# Altium schematic symbol library 13-Logic 数字 IC.SchLib: 324 symbols (part 11 of 30)
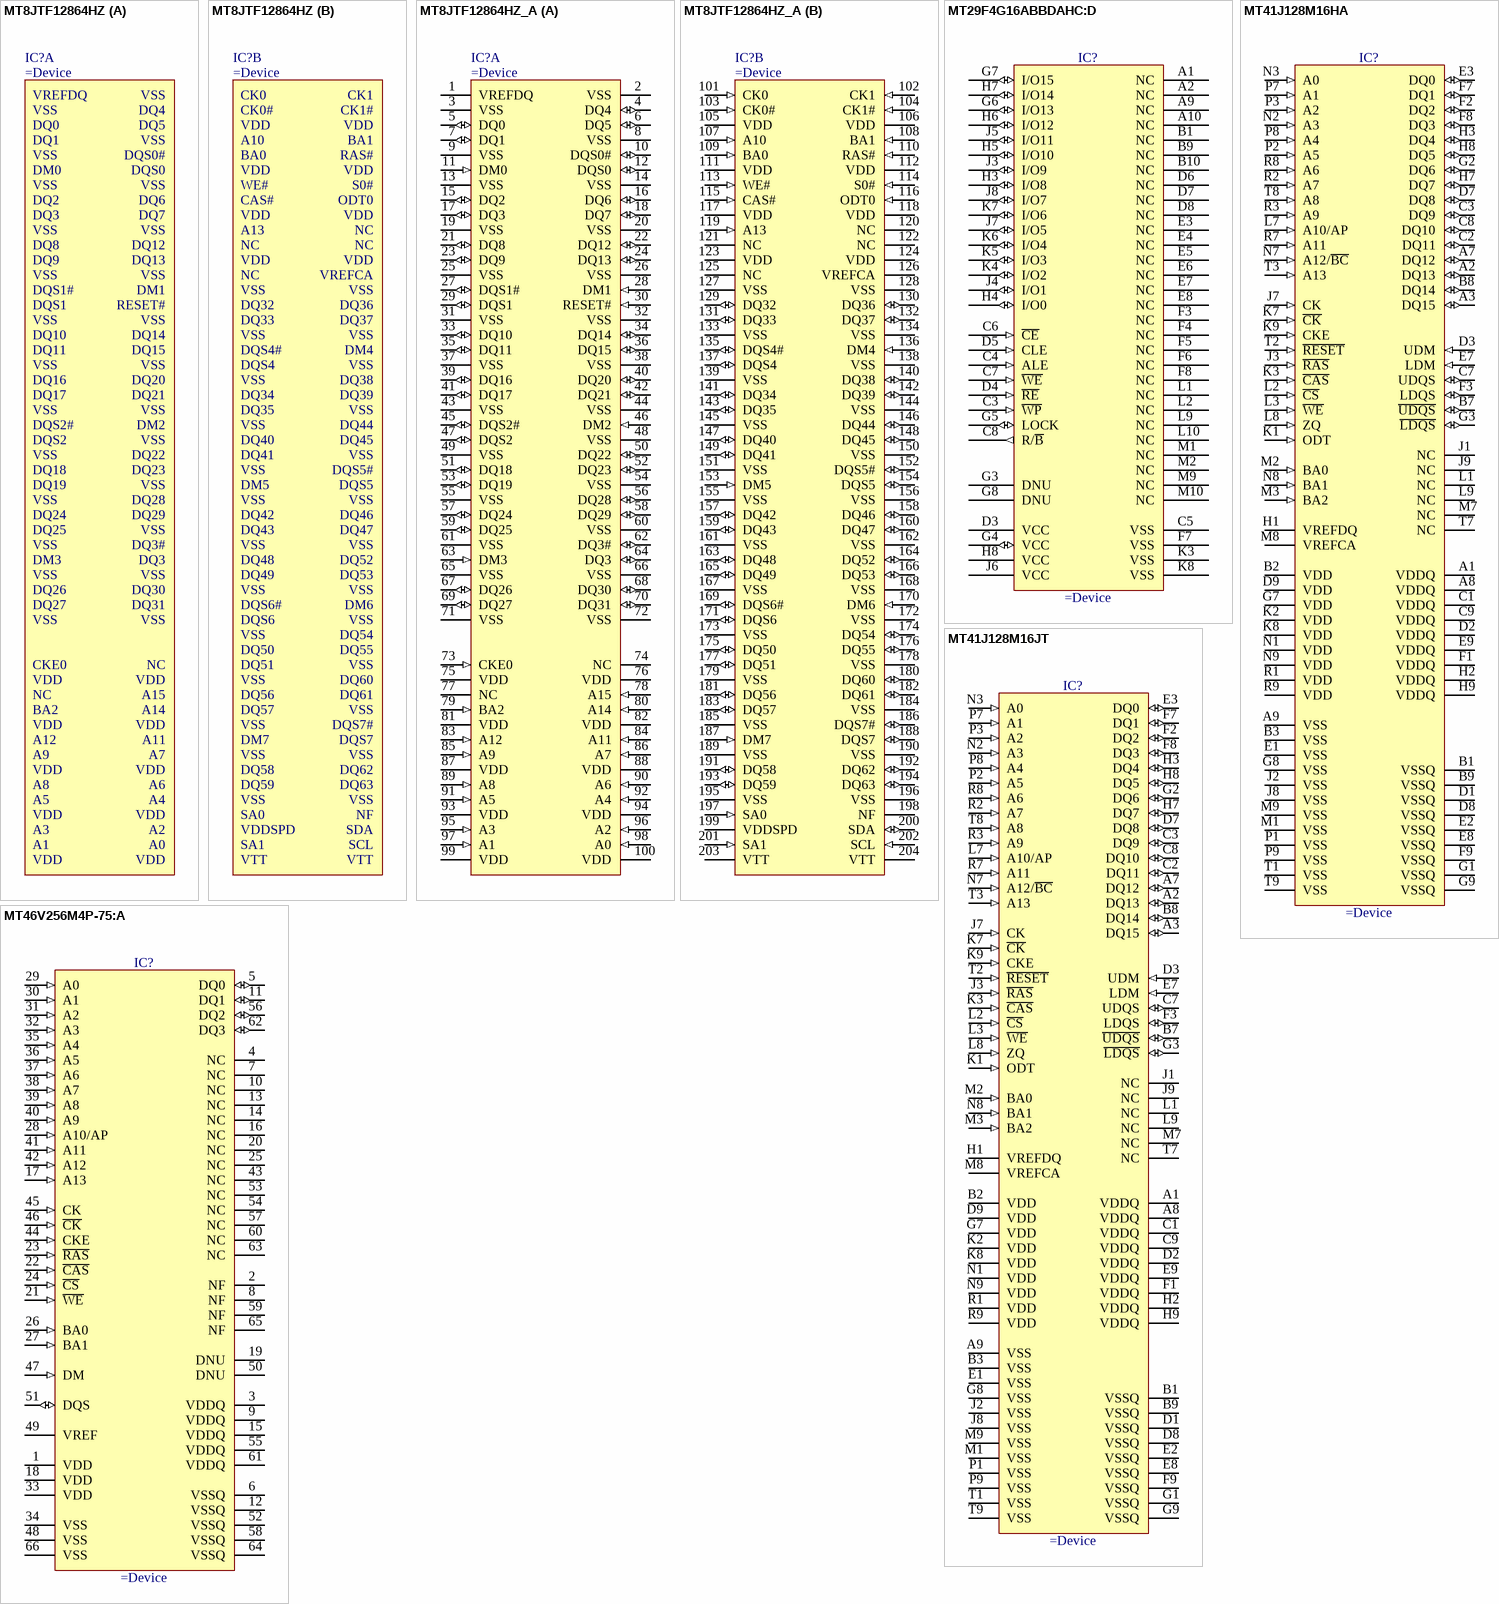
[diagram p173: symbols MT8JTF12864HZ to MT46V256M4P-75:A]

## MT8JTF12864HZ_A
designator IC?
1Gb (128Mx64) SODIMM 204-Pin DDR3 SDRAM Module
part A pins: 1 VREFDQ (power), 2 VSS (power), 3 VSS (power), 4 DQ4 (io), 5 DQ0 (io), 6 DQ5 (io), 7 DQ1 (io), 8 VSS (power), 9 VSS (power), 10 DQS0# (io), 11 DM0 (in), 12 DQS0 (io), 13 VSS (power), 14 VSS (power), 15 DQ2 (io), 16 DQ6 (io), 17 DQ3 (io), 18 DQ7 (io), 19 VSS (power), 20 VSS (power), 21 DQ8 (io), 22 DQ12 (io), 23 DQ9 (io), 24 DQ13 (io), 25 VSS (power), 26 VSS (power), 27 DQS1# (io), 28 DM1 (in), 29 DQS1 (io), 30 RESET# (in), 31 VSS (power), 32 VSS (power), 33 DQ10 (io), 34 DQ14 (io), 35 DQ11 (io), 36 DQ15 (io), 37 VSS (power), 38 VSS (power), 39 DQ16 (io), 40 DQ20 (io), 41 DQ17 (io), 42 DQ21 (io), 43 VSS (power), 44 VSS (power), 45 DQS2# (io), 46 DM2 (in), 47 DQS2 (io), 48 VSS (power), 49 VSS (power), 50 DQ22 (io), 51 DQ18 (io), 52 DQ23 (io), 53 DQ19 (io), 54 VSS (power), 55 VSS (power), 56 DQ28 (io), 57 DQ24 (io), 58 DQ29 (io), 59 DQ25 (io), 60 VSS (power), 61 VSS (power), 62 DQ3# (io), 63 DM3 (in), 64 DQ3 (io), 65 VSS (power), 66 VSS (power), 67 DQ26 (io), 68 DQ30 (io), 69 DQ27 (io), 70 DQ31 (io), 71 VSS (power), 72 VSS (power), 73 CKE0 (in), 74 NC, 75 VDD (power), 76 VDD (power), 77 NC, 78 A15 (in), 79 BA2 (in), 80 A14 (in), 81 VDD (power), 82 VDD (power), 83 A12 (in), 84 A11 (in), 85 A9 (in), 86 A7 (in), 87 VDD (power), 88 VDD (power), 89 A8 (in), 90 A6 (in), 91 A5 (in), 92 A4 (in), 93 VDD (power), 94 VDD (power), 95 A3 (in), 96 A2 (in), 97 A1 (in), 98 A0 (in), 99 VDD (power), 100 VDD (power)
part B pins: 101 CK0 (in), 102 CK1 (in), 103 CK0# (in), 104 CK1# (in), 105 VDD (power), 106 VDD (power), 107 A10 (in), 108 BA1 (in), 109 BA0 (in), 110 RAS# (in), 111 VDD (power), 112 VDD (power), 113 WE# (in), 114 S0# (in), 115 CAS# (in), 116 ODT0 (in), 117 VDD (power), 118 VDD (power), 119 A13 (in), 120 NC, 121 NC, 122 NC, 123 VDD (power), 124 VDD (power), 125 NC, 126 VREFCA (power), 127 VSS (power), 128 VSS (power), 129 DQ32 (io), 130 DQ36 (io), 131 DQ33 (io), 132 DQ37 (io), 133 VSS (power), 134 VSS (power), 135 DQS4# (io), 136 DM4 (in), 137 DQS4 (io), 138 VSS (power), 139 VSS (power), 140 DQ38 (io), 141 DQ34 (io), 142 DQ39 (io), 143 DQ35 (io), 144 VSS (power), 145 VSS (power), 146 DQ44 (io), 147 DQ40 (io), 148 DQ45 (io), 149 DQ41 (io), 150 VSS (power), 151 VSS (power), 152 DQS5# (io), 153 DM5 (in), 154 DQS5 (io), 155 VSS (power), 156 VSS (power), 157 DQ42 (io), 158 DQ46 (io), 159 DQ43 (io), 160 DQ47 (io), 161 VSS (power), 162 VSS (power), 163 DQ48 (io), 164 DQ52 (io), 165 DQ49 (io), 166 DQ53 (io), 167 VSS (power), 168 VSS (power), 169 DQS6# (io), 170 DM6 (in), 171 DQS6 (io), 172 VSS (power), 173 VSS (power), 174 DQ54 (io), 175 DQ50 (io), 176 DQ55 (io), 177 DQ51 (io), 178 VSS (power), 179 VSS (power), 180 DQ60 (io), 181 DQ56 (io), 182 DQ61 (io), 183 DQ57 (io), 184 VSS (power), 185 VSS (power), 186 DQS7# (io), 187 DM7 (in), 188 DQS7 (io), 189 VSS (power), 190 VSS (power), 191 DQ58 (io), 192 DQ62 (io), 193 DQ59 (io), 194 DQ63 (io), 195 VSS (power), 196 VSS (power), 197 SA0 (in), 198 NF, 199 VDDSPD (power), 200 SDA (io), 201 SA1 (in), 202 SCL (in), 203 VTT (power), 204 VTT (power)

## MT29F4G16ABBDAHC:D
designator IC?
4Gb, 16-Bit, 1.8V, NAND Flash
pins: A1 NC, A2 NC, A9 NC, A10 NC, B1 NC, B9 NC, B10 NC, C3 ~{WP} (in), C4 ALE (in), C5 VSS (power), C6 ~{CE} (in), C7 ~{WE} (in), C8 R/~{B} (out), D3 VCC (power), D4 ~{RE} (in), D5 CLE (in), D6 NC, D7 NC, D8 NC, E3 NC, E4 NC, E5 NC, E6 NC, E7 NC, E8 NC, F3 NC, F4 NC, F5 NC, F6 NC, F7 VSS (power), F8 NC, G3 DNU, G4 VCC (io), G5 LOCK (io), G6 I/O13 (io), G7 I/O15 (io), G8 DNU, H3 I/O8 (io), H4 I/O0 (io), H5 I/O10 (io), H6 I/O12 (io), H7 I/O14 (io), H8 VCC (power), J3 I/O9 (io), J4 I/O1 (io), J5 I/O11 (io), J6 VCC (power), J7 I/O5 (io), J8 I/O7 (io), K3 VSS (power), K4 I/O2 (io), K5 I/O3 (io), K6 I/O4 (io), K7 I/O6 (io), K8 VSS (power), L1 NC, L2 NC, L9 NC, L10 NC, M1 NC, M2 NC, M9 NC, M10 NC

## MT41J128M16HA
designator IC?
16 Meg x 16 x 8 Banks DDR3 SDRAM
pins: A1 VDDQ (power), A2 DQ13 (io), A3 DQ15 (io), A7 DQ12 (io), A8 VDDQ (power), A9 VSS (power), B1 VSSQ (power), B2 VDD (power), B3 VSS (power), B7 ~{UDQS} (io), B8 DQ14 (io), B9 VSSQ (power), C1 VDDQ (power), C2 DQ11 (io), C3 DQ9 (io), C7 UDQS (io), C8 DQ10 (io), C9 VDDQ (power), D1 VSSQ (power), D2 VDDQ (power), D3 UDM (in), D7 DQ8 (io), D8 VSSQ (power), D9 VDD (power), E1 VSS (power), E2 VSSQ (power), E3 DQ0 (io), E7 LDM (in), E8 VSSQ (power), E9 VDDQ (power), F1 VDDQ (power), F2 DQ2 (io), F3 LDQS (io), F7 DQ1 (io), F8 DQ3 (io), F9 VSSQ (power), G1 VSSQ (power), G2 DQ6 (io), G3 ~{LDQS} (io), G7 VDD (power), G8 VSS (power), G9 VSSQ (power), H1 VREFDQ (power), H2 VDDQ (power), H3 DQ4 (io), H7 DQ7 (io), H8 DQ5 (io), H9 VDDQ (power), J1 NC, J2 VSS (power), J3 ~{RAS} (in), J7 CK (in), J8 VSS (power), J9 NC, K1 ODT (in), K2 VDD (power), K3 ~{CAS} (in), K7 ~{CK} (in), K8 VDD (power), K9 CKE (in), L1 NC, L2 ~{CS} (in), L3 ~{WE} (in), L7 A10/AP (in), L8 ZQ (in), L9 NC, M1 VSS (power), M2 BA0 (in), M3 BA2 (in), M7 NC, M8 VREFCA (power), M9 VSS (power), N1 VDD (power), N2 A3 (in), N3 A0 (in), N7 A12/~{BC} (in), N8 BA1 (in), N9 VDD (power), P1 VSS (power), P2 A5 (in), P3 A2 (in), P7 A1 (in), P8 A4 (in), P9 VSS (power), R1 VDD (power), R2 A7 (in), R3 A9 (in), R7 A11 (in), R8 A6 (in), R9 VDD (power), T1 VSS (power), T2 ~{RESET} (in), T3 A13 (in), T7 NC, T8 A8 (in), T9 VSS (power)

## MT41J128M16JT
designator IC?
16 Meg x 16 x 8 Banks DDR3 SDRAM
pins: A1 VDDQ (power), A2 DQ13 (io), A3 DQ15 (io), A7 DQ12 (io), A8 VDDQ (power), A9 VSS (power), B1 VSSQ (power), B2 VDD (power), B3 VSS (power), B7 ~{UDQS} (io), B8 DQ14 (io), B9 VSSQ (power), C1 VDDQ (power), C2 DQ11 (io), C3 DQ9 (io), C7 UDQS (io), C8 DQ10 (io), C9 VDDQ (power), D1 VSSQ (power), D2 VDDQ (power), D3 UDM (in), D7 DQ8 (io), D8 VSSQ (power), D9 VDD (power), E1 VSS (power), E2 VSSQ (power), E3 DQ0 (io), E7 LDM (in), E8 VSSQ (power), E9 VDDQ (power), F1 VDDQ (power), F2 DQ2 (io), F3 LDQS (io), F7 DQ1 (io), F8 DQ3 (io), F9 VSSQ (power), G1 VSSQ (power), G2 DQ6 (io), G3 ~{LDQS} (io), G7 VDD (power), G8 VSS (power), G9 VSSQ (power), H1 VREFDQ (power), H2 VDDQ (power), H3 DQ4 (io), H7 DQ7 (io), H8 DQ5 (io), H9 VDDQ (power), J1 NC, J2 VSS (power), J3 ~{RAS} (in), J7 CK (in), J8 VSS (power), J9 NC, K1 ODT (in), K2 VDD (power), K3 ~{CAS} (in), K7 ~{CK} (in), K8 VDD (power), K9 CKE (in), L1 NC, L2 ~{CS} (in), L3 ~{WE} (in), L7 A10/AP (in), L8 ZQ (in), L9 NC, M1 VSS (power), M2 BA0 (in), M3 BA2 (in), M7 NC, M8 VREFCA (power), M9 VSS (power), N1 VDD (power), N2 A3 (in), N3 A0 (in), N7 A12/~{BC} (in), N8 BA1 (in), N9 VDD (power), P1 VSS (power), P2 A5 (in), P3 A2 (in), P7 A1 (in), P8 A4 (in), P9 VSS (power), R1 VDD (power), R2 A7 (in), R3 A9 (in), R7 A11 (in), R8 A6 (in), R9 VDD (power), T1 VSS (power), T2 ~{RESET} (in), T3 A13 (in), T7 NC, T8 A8 (in), T9 VSS (power)

## MT46V256M4P-75:A
designator IC?
2.5V, 1Gb (256M x 4) DDR SDRAM
pins: 1 VDD (power), 2 NF, 3 VDDQ (power), 4 NC, 5 DQ0 (io), 6 VSSQ (power), 7 NC, 8 NF, 9 VDDQ (power), 10 NC, 11 DQ1 (io), 12 VSSQ (power), 13 NC, 14 NC, 15 VDDQ (power), 16 NC, 17 A13 (in), 18 VDD (power), 19 DNU, 20 NC, 21 ~{WE} (in), 22 ~{CAS} (in), 23 ~{RAS} (in), 24 ~{CS} (in), 25 NC, 26 BA0 (in), 27 BA1 (in), 28 A10/AP (in), 29 A0 (in), 30 A1 (in), 31 A2 (in), 32 A3 (in), 33 VDD (power), 34 VSS (power), 35 A4 (in), 36 A5 (in), 37 A6 (in), 38 A7 (in), 39 A8 (in), 40 A9 (in), 41 A11 (in), 42 A12 (in), 43 NC, 44 CKE (in), 45 CK (in), 46 ~{CK} (in), 47 DM (in), 48 VSS (power), 49 VREF (power), 50 DNU, 51 DQS (io), 52 VSSQ (power), 53 NC, 54 NC, 55 VDDQ (power), 56 DQ2 (io), 57 NC, 58 VSSQ (power), 59 NF, 60 NC, 61 VDDQ (power), 62 DQ3 (io), 63 NC, 64 VSSQ (power), 65 NF, 66 VSS (power)

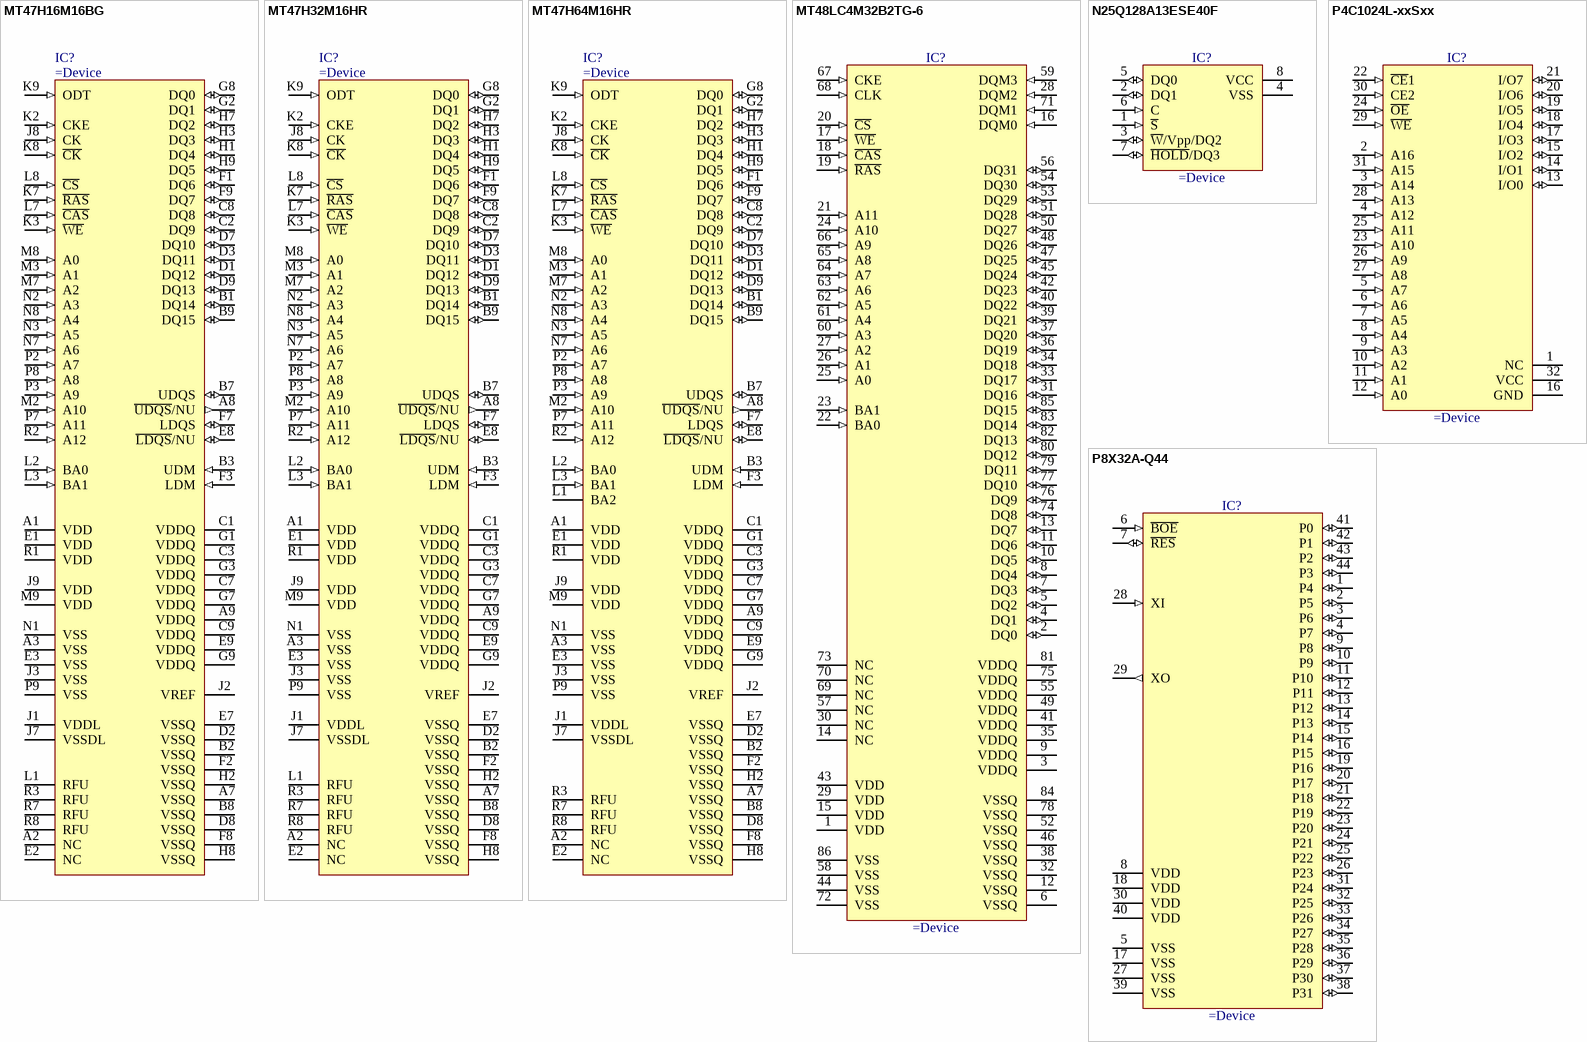
[diagram p66: symbols MT47H16M16BG to P8X32A-Q44]

## MT47H16M16BG
designator IC?
DDR2 SDRAM 4 Meg x 16 x 4 Banks
pins: A1 VDD (power), A2 NC, A3 VSS (power), A7 VSSQ (power), A8 ~{UDQS}/NU (out), A9 VDDQ (power), B1 DQ14 (io), B2 VSSQ (power), B3 UDM (in), B7 UDQS (io), B8 VSSQ (power), B9 DQ15 (io), C1 VDDQ (power), C2 DQ9 (io), C3 VDDQ (power), C7 VDDQ (power), C8 DQ8 (io), C9 VDDQ (power), D1 DQ12 (io), D2 VSSQ (power), D3 DQ11 (io), D7 DQ10 (io), D8 VSSQ (power), D9 DQ13 (io), E1 VDD (power), E2 NC, E3 VSS (power), E7 VSSQ (power), E8 ~{LDQS}/NU (io), E9 VDDQ (power), F1 DQ6 (io), F2 VSSQ (power), F3 LDM (in), F7 LDQS (io), F8 VSSQ (power), F9 DQ7 (io), G1 VDDQ (power), G2 DQ1 (io), G3 VDDQ (power), G7 VDDQ (power), G8 DQ0 (io), G9 VDDQ (power), H1 DQ4 (io), H2 VSSQ (power), H3 DQ3 (io), H7 DQ2 (io), H8 VSSQ (power), H9 DQ5 (io), J1 VDDL (power), J2 VREF (power), J3 VSS (power), J7 VSSDL (power), J8 CK (in), J9 VDD (power), K2 CKE (in), K3 ~{WE} (in), K7 ~{RAS} (in), K8 ~{CK} (in), K9 ODT (in), L1 RFU, L2 BA0 (in), L3 BA1 (in), L7 ~{CAS} (in), L8 ~{CS} (in), M2 A10 (in), M3 A1 (in), M7 A2 (in), M8 A0 (in), M9 VDD (power), N1 VSS (power), N2 A3 (in), N3 A5 (in), N7 A6 (in), N8 A4 (in), P2 A7 (in), P3 A9 (in), P7 A11 (in), P8 A8 (in), P9 VSS (power), R1 VDD (power), R2 A12 (in), R3 RFU, R7 RFU, R8 RFU

## MT47H32M16HR
designator IC?
DDR2 SDRAM 512M (32 x 16)
pins: A1 VDD (power), A2 NC, A3 VSS (power), A7 VSSQ (power), A8 ~{UDQS}/NU (out), A9 VDDQ (power), B1 DQ14 (io), B2 VSSQ (power), B3 UDM (in), B7 UDQS (io), B8 VSSQ (power), B9 DQ15 (io), C1 VDDQ (power), C2 DQ9 (io), C3 VDDQ (power), C7 VDDQ (power), C8 DQ8 (io), C9 VDDQ (power), D1 DQ12 (io), D2 VSSQ (power), D3 DQ11 (io), D7 DQ10 (io), D8 VSSQ (power), D9 DQ13 (io), E1 VDD (power), E2 NC, E3 VSS (power), E7 VSSQ (power), E8 ~{LDQS}/NU (io), E9 VDDQ (power), F1 DQ6 (io), F2 VSSQ (power), F3 LDM (in), F7 LDQS (io), F8 VSSQ (power), F9 DQ7 (io), G1 VDDQ (power), G2 DQ1 (io), G3 VDDQ (power), G7 VDDQ (power), G8 DQ0 (io), G9 VDDQ (power), H1 DQ4 (io), H2 VSSQ (power), H3 DQ3 (io), H7 DQ2 (io), H8 VSSQ (power), H9 DQ5 (io), J1 VDDL (power), J2 VREF (power), J3 VSS (power), J7 VSSDL (power), J8 CK (in), J9 VDD (power), K2 CKE (in), K3 ~{WE} (in), K7 ~{RAS} (in), K8 ~{CK} (in), K9 ODT (in), L1 RFU, L2 BA0 (in), L3 BA1 (in), L7 ~{CAS} (in), L8 ~{CS} (in), M2 A10 (in), M3 A1 (in), M7 A2 (in), M8 A0 (in), M9 VDD (power), N1 VSS (power), N2 A3 (in), N3 A5 (in), N7 A6 (in), N8 A4 (in), P2 A7 (in), P3 A9 (in), P7 A11 (in), P8 A8 (in), P9 VSS (power), R1 VDD (power), R2 A12 (in), R3 RFU, R7 RFU, R8 RFU

## MT47H64M16HR
designator IC?
DDR2 SDRAM 64 Meg x 16 x 8 Banks
pins: A1 VDD (power), A2 NC, A3 VSS (power), A7 VSSQ (power), A8 ~{UDQS}/NU (out), A9 VDDQ (power), B1 DQ14 (io), B2 VSSQ (power), B3 UDM (in), B7 UDQS (io), B8 VSSQ (power), B9 DQ15 (io), C1 VDDQ (power), C2 DQ9 (io), C3 VDDQ (power), C7 VDDQ (power), C8 DQ8 (io), C9 VDDQ (power), D1 DQ12 (io), D2 VSSQ (power), D3 DQ11 (io), D7 DQ10 (io), D8 VSSQ (power), D9 DQ13 (io), E1 VDD (power), E2 NC, E3 VSS (power), E7 VSSQ (power), E8 ~{LDQS}/NU (io), E9 VDDQ (power), F1 DQ6 (io), F2 VSSQ (power), F3 LDM (in), F7 LDQS (io), F8 VSSQ (power), F9 DQ7 (io), G1 VDDQ (power), G2 DQ1 (io), G3 VDDQ (power), G7 VDDQ (power), G8 DQ0 (io), G9 VDDQ (power), H1 DQ4 (io), H2 VSSQ (power), H3 DQ3 (io), H7 DQ2 (io), H8 VSSQ (power), H9 DQ5 (io), J1 VDDL (power), J2 VREF (power), J3 VSS (power), J7 VSSDL (power), J8 CK (in), J9 VDD (power), K2 CKE (in), K3 ~{WE} (in), K7 ~{RAS} (in), K8 ~{CK} (in), K9 ODT (in), L1 BA2, L2 BA0 (in), L3 BA1 (in), L7 ~{CAS} (in), L8 ~{CS} (in), M2 A10 (in), M3 A1 (in), M7 A2 (in), M8 A0 (in), M9 VDD (power), N1 VSS (power), N2 A3 (in), N3 A5 (in), N7 A6 (in), N8 A4 (in), P2 A7 (in), P3 A9 (in), P7 A11 (in), P8 A8 (in), P9 VSS (power), R1 VDD (power), R2 A12 (in), R3 RFU, R7 RFU, R8 RFU

## MT48LC4M32B2TG-6
designator IC?
4M x 32 Synchronous DRAM
pins: 1 VDD (power), 2 DQ0 (io), 3 VDDQ (power), 4 DQ1 (io), 5 DQ2 (io), 6 VSSQ (power), 7 DQ3 (io), 8 DQ4 (io), 9 VDDQ (power), 10 DQ5 (io), 11 DQ6 (io), 12 VSSQ (power), 13 DQ7 (io), 14 NC, 15 VDD (power), 16 DQM0 (in), 17 ~{WE} (in), 18 ~{CAS} (in), 19 ~{RAS} (in), 20 ~{CS} (in), 21 A11 (in), 22 BA0 (in), 23 BA1 (in), 24 A10 (in), 25 A0 (in), 26 A1 (in), 27 A2 (in), 28 DQM2 (in), 29 VDD (power), 30 NC, 31 DQ16 (io), 32 VSSQ (power), 33 DQ17 (io), 34 DQ18 (io), 35 VDDQ (power), 36 DQ19 (io), 37 DQ20 (io), 38 VSSQ (power), 39 DQ21 (io), 40 DQ22 (io), 41 VDDQ (power), 42 DQ23 (io), 43 VDD (power), 44 VSS (power), 45 DQ24 (io), 46 VSSQ (power), 47 DQ25 (io), 48 DQ26 (io), 49 VDDQ (power), 50 DQ27 (io), 51 DQ28 (io), 52 VSSQ (power), 53 DQ29 (io), 54 DQ30 (io), 55 VDDQ (power), 56 DQ31 (io), 57 NC, 58 VSS (power), 59 DQM3 (in), 60 A3 (in), 61 A4 (in), 62 A5 (in), 63 A6 (in), 64 A7 (in), 65 A8 (in), 66 A9 (in), 67 CKE (in), 68 CLK (in), 69 NC, 70 NC, 71 DQM1 (in), 72 VSS (power), 73 NC, 74 DQ8 (io), 75 VDDQ (power), 76 DQ9 (io), 77 DQ10 (io), 78 VSSQ (power), 79 DQ11 (io), 80 DQ12 (io), 81 VDDQ (power), 82 DQ13 (io), 83 DQ14 (io), 84 VSSQ (power), 85 DQ15 (io), 86 VSS (power)

## N25Q128A13ESE40F
designator IC?
128Mb, 3V, Multiple I/O Serial NOR Flash Memory
pins: 1 ~{S} (in), 2 DQ1 (io), 3 ~{W}/Vpp/DQ2 (io), 4 VSS (power), 5 DQ0 (io), 6 C (in), 7 ~{HOLD}/DQ3 (io), 8 VCC (power)

## P4C1024L-xxSxx
designator IC?
5V Low Power 128K x 8 CMOS Static RAM
pins: 1 NC, 2 A16 (in), 3 A14 (in), 4 A12 (in), 5 A7 (in), 6 A6 (in), 7 A5 (in), 8 A4 (in), 9 A3 (in), 10 A2 (in), 11 A1 (in), 12 A0 (in), 13 I/O0 (io), 14 I/O1 (io), 15 I/O2 (io), 16 GND (power), 17 I/O3 (io), 18 I/O4 (io), 19 I/O5 (io), 20 I/O6 (io), 21 I/O7 (io), 22 ~{CE}1 (in), 23 A10 (in), 24 ~{OE} (in), 25 A11 (in), 26 A9 (in), 27 A8 (in), 28 A13 (in), 29 ~{WE} (in), 30 CE2 (in), 31 A15 (in), 32 VCC (power)

## P8X32A-Q44
designator IC?
32-Bit PROPELLER MCU
pins: 1 P4 (io), 2 P5 (io), 3 P6 (io), 4 P7 (io), 5 VSS (power), 6 ~{BOE} (in), 7 ~{RES} (io), 8 VDD (power), 9 P8 (io), 10 P9 (io), 11 P10 (io), 12 P11 (io), 13 P12 (io), 14 P13 (io), 15 P14 (io), 16 P15 (io), 17 VSS (power), 18 VDD (power), 19 P16 (io), 20 P17 (io), 21 P18 (io), 22 P19 (io), 23 P20 (io), 24 P21 (io), 25 P22 (io), 26 P23 (io), 27 VSS (power), 28 XI (in), 29 XO (out), 30 VDD (power), 31 P24 (io), 32 P25 (io), 33 P26 (io), 34 P27 (io), 35 P28 (io), 36 P29 (io), 37 P30 (io), 38 P31 (io), 39 VSS (power), 40 VDD (power), 41 P0 (io), 42 P1 (io), 43 P2 (io), 44 P3 (io)

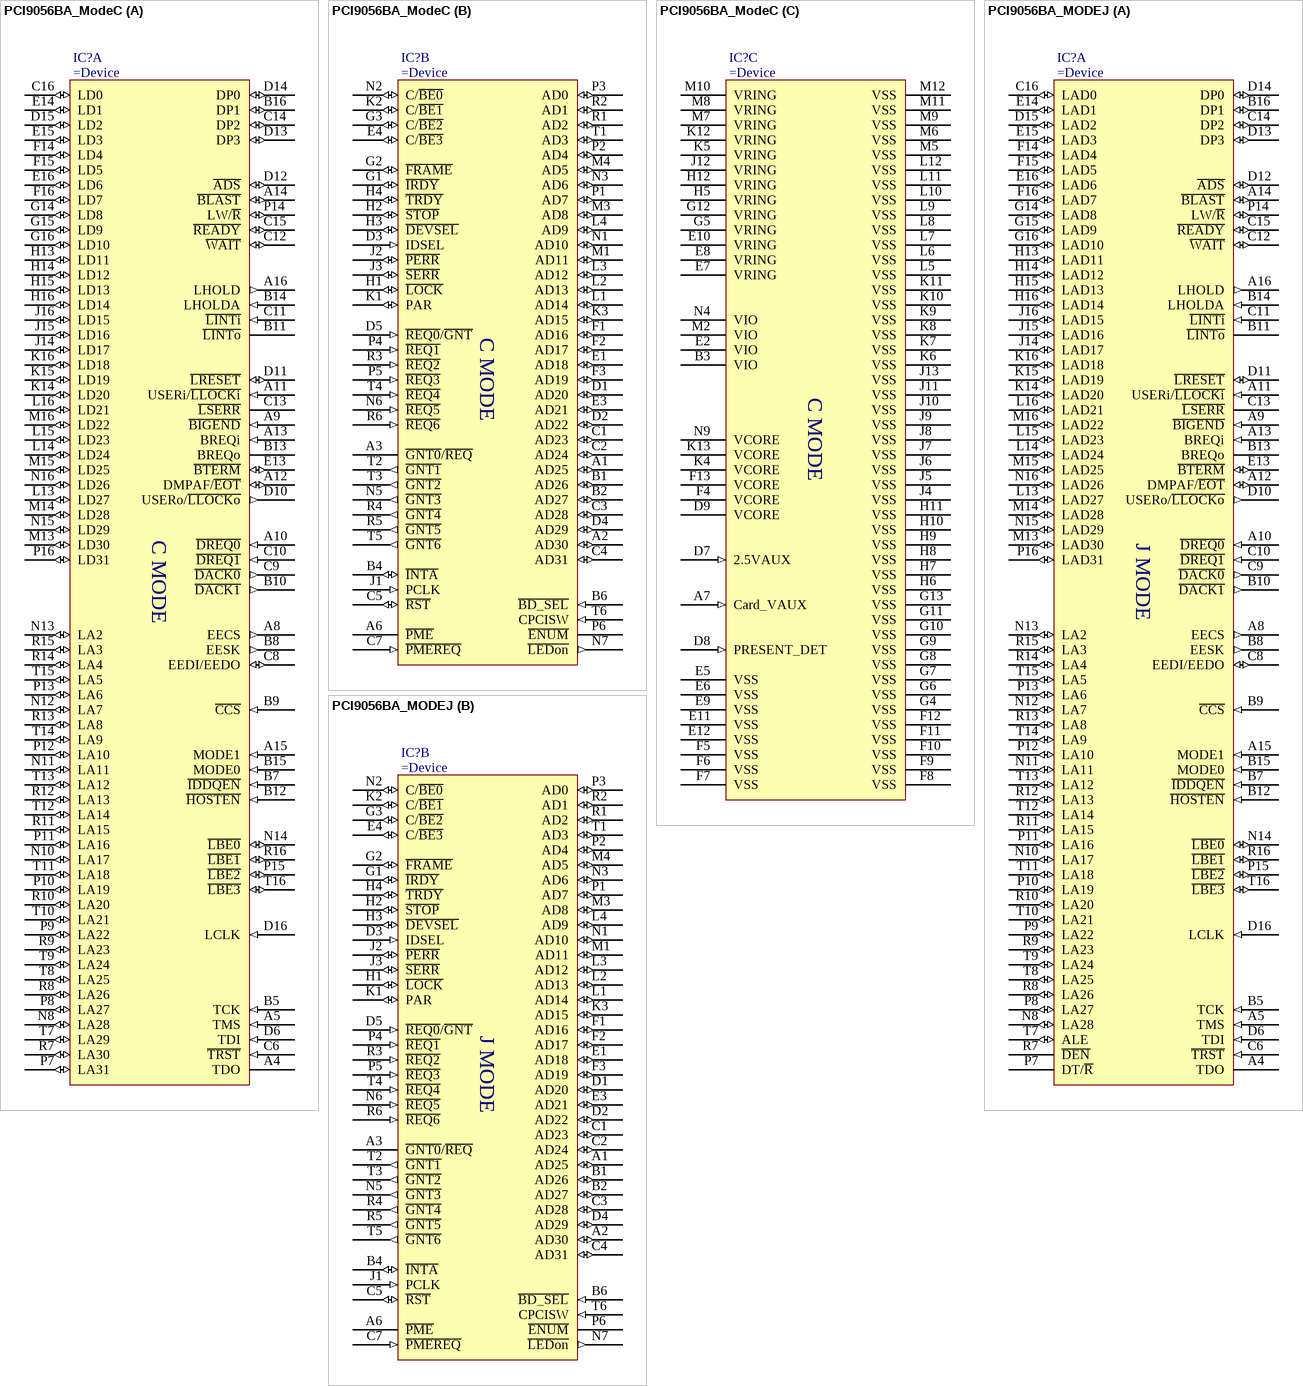
[diagram p67: symbols PCI9056BA_ModeC to PCI9056BA_MODEJ]

## PCI9056BA_ModeC
designator IC?
32-Bit 66MHz PCI Bus Mastering I/O Accelerator For PowerQUICC And Generic 32-Bit, 66MHz Local Bus Design
part A pins: A4 TDO (hiz), A5 TMS (in), A8 EECS (out), A9 ~{BIGEND} (in), A10 ~{DREQ0} (in), A11 USERi/~{LLOCKi} (in), A12 DMPAF/~{EOT} (io), A13 BREQi (in), A14 ~{BLAST} (io), A15 MODE1 (in), A16 LHOLD (out), B5 TCK (in), B7 ~{IDDQEN} (in), B8 EESK (out), B9 ~{CCS} (in), B10 ~{DACK1} (out), B11 ~{LINTo} (oc), B12 ~{HOSTEN} (in), B13 BREQo (hiz), B14 LHOLDA (in), B15 MODE0 (in), B16 DP1 (io), C6 ~{TRST} (in), C8 EEDI/EEDO (io), C9 ~{DACK0} (out), C10 ~{DREQ1} (in), C11 ~{LINTi} (in), C12 ~{WAIT} (io), C13 ~{LSERR} (oc), C14 DP2 (io), C15 ~{READY} (io), C16 LD0 (io), D6 TDI (in), D10 USERo/~{LLOCKo} (out), D11 ~{LRESET} (io), D12 ~{ADS} (io), D13 DP3 (io), D14 DP0 (io), D15 LD2 (io), D16 LCLK (in), E13 ~{BTERM} (io), E14 LD1 (io), E15 LD3 (io), E16 LD6 (io), F14 LD4 (io), F15 LD5 (io), F16 LD7 (io), G14 LD8 (io), G15 LD9 (io), G16 LD10 (io), H13 LD11 (io), H14 LD12 (io), H15 LD13 (io), H16 LD14 (io), J14 LD17 (io), J15 LD16 (io), J16 LD15 (io), K14 LD20 (io), K15 LD19 (io), K16 LD18 (io), L13 LD27 (io), L14 LD24 (io), L15 LD23 (io), L16 LD21 (io), M13 LD30 (io), M14 LD28 (io), M15 LD25 (io), M16 LD22 (io), N8 LA28 (io), N10 LA17 (io), N11 LA11 (io), N12 LA7 (io), N13 LA2 (io), N14 ~{LBE0} (io), N15 LD29 (io), N16 LD26 (io), P7 LA31 (io), P8 LA27 (io), P9 LA22 (io), P10 LA19 (io), P11 LA16 (io), P12 LA10 (io), P13 LA6 (io), P14 LW/~{R} (io), P15 ~{LBE2} (io), P16 LD31 (io), R7 LA30 (io), R8 LA26 (io), R9 LA23 (io), R10 LA20 (io), R11 LA15 (io), R12 LA13 (io), R13 LA8 (io), R14 LA4 (io), R15 LA3 (io), R16 ~{LBE1} (io), T7 LA29 (io), T8 LA25 (io), T9 LA24 (io), T10 LA21 (io), T11 LA18 (io), T12 LA14 (io), T13 LA12 (io), T14 LA9 (io), T15 LA5 (io), T16 ~{LBE3} (io)
part B pins: A1 AD25 (io), A2 AD30 (io), A3 ~{GNT0}/~{REQ} (hiz), A6 ~{PME} (oc), B1 AD26 (io), B2 AD27 (io), B4 ~{INTA} (io), B6 ~{BD_SEL} (in), C1 AD23 (io), C2 AD24 (io), C3 AD28 (io), C4 AD31 (io), C5 ~{RST} (io), C7 ~{PMEREQ} (in), D1 AD20 (io), D2 AD22 (io), D3 IDSEL (in), D4 AD29 (io), D5 ~{REQ0}/~{GNT} (in), E1 AD18 (io), E3 AD21 (io), E4 C/~{BE3} (io), F1 AD16 (io), F2 AD17 (io), F3 AD19 (io), G1 ~{IRDY} (io), G2 ~{FRAME} (io), G3 C/~{BE2} (io), H1 ~{LOCK} (io), H2 ~{STOP} (io), H3 ~{DEVSEL} (io), H4 ~{TRDY} (io), J1 PCLK (in), J2 ~{PERR} (io), J3 ~{SERR} (io), K1 PAR (io), K2 C/~{BE1} (io), K3 AD15 (io), L1 AD14 (io), L2 AD13 (io), L3 AD12 (io), L4 AD9 (io), M1 AD11 (io), M3 AD8 (io), M4 AD5 (io), N1 AD10 (io), N2 C/~{BE0} (io), N3 AD6 (io), N5 ~{GNT3} (out), N6 ~{REQ5} (in), N7 ~{LEDon} (out), P1 AD7 (io), P2 AD4 (io), P3 AD0 (io), P4 ~{REQ1} (in), P5 ~{REQ3} (in), P6 ~{ENUM} (oc), R1 AD2 (io), R2 AD1 (io), R3 ~{REQ2} (in), R4 ~{GNT4} (out), R5 ~{GNT5} (out), R6 ~{REQ6} (in), T1 AD3 (io), T2 ~{GNT1} (out), T3 ~{GNT2} (out), T4 ~{REQ4} (in), T5 ~{GNT6} (out), T6 CPCISW (in)
part C pins: A7 Card_VAUX (in), B3 VIO (power), D7 2.5VAUX (in), D8 PRESENT_DET (in), D9 VCORE (power), E2 VIO (power), E5 VSS (power), E6 VSS (power), E7 VRING (power), E8 VRING (power), E9 VSS (power), E10 VRING (power), E11 VSS (power), E12 VSS (power), F4 VCORE (power), F5 VSS (power), F6 VSS (power), F7 VSS (power), F8 VSS (power), F9 VSS (power), F10 VSS (power), F11 VSS (power), F12 VSS (power), F13 VCORE (power), G4 VSS (power), G5 VRING (power), G6 VSS (power), G7 VSS (power), G8 VSS (power), G9 VSS (power), G10 VSS (power), G11 VSS (power), G12 VRING (power), G13 VSS (power), H5 VRING (power), H6 VSS (power), H7 VSS (power), H8 VSS (power), H9 VSS (power), H10 VSS (power), H11 VSS (power), H12 VRING (power), J4 VSS (power), J5 VSS (power), J6 VSS (power), J7 VSS (power), J8 VSS (power), J9 VSS (power), J10 VSS (power), J11 VSS (power), J12 VRING (power), J13 VSS (power), K4 VCORE (power), K5 VRING (power), K6 VSS (power), K7 VSS (power), K8 VSS (power), K9 VSS (power), K10 VSS (power), K11 VSS (power), K12 VRING (power), K13 VCORE (power), L5 VSS (power), L6 VSS (power), L7 VSS (power), L8 VSS (power), L9 VSS (power), L10 VSS (power), L11 VSS (power), L12 VSS (power), M2 VIO (power), M5 VSS (power), M6 VSS (power), M7 VRING (power), M8 VRING (power), M9 VSS (power), M10 VRING (power), M11 VSS (power), M12 VSS (power), N4 VIO (power), N9 VCORE (power)
part A text: C MODE
part B text: C MODE
part C text: C MODE

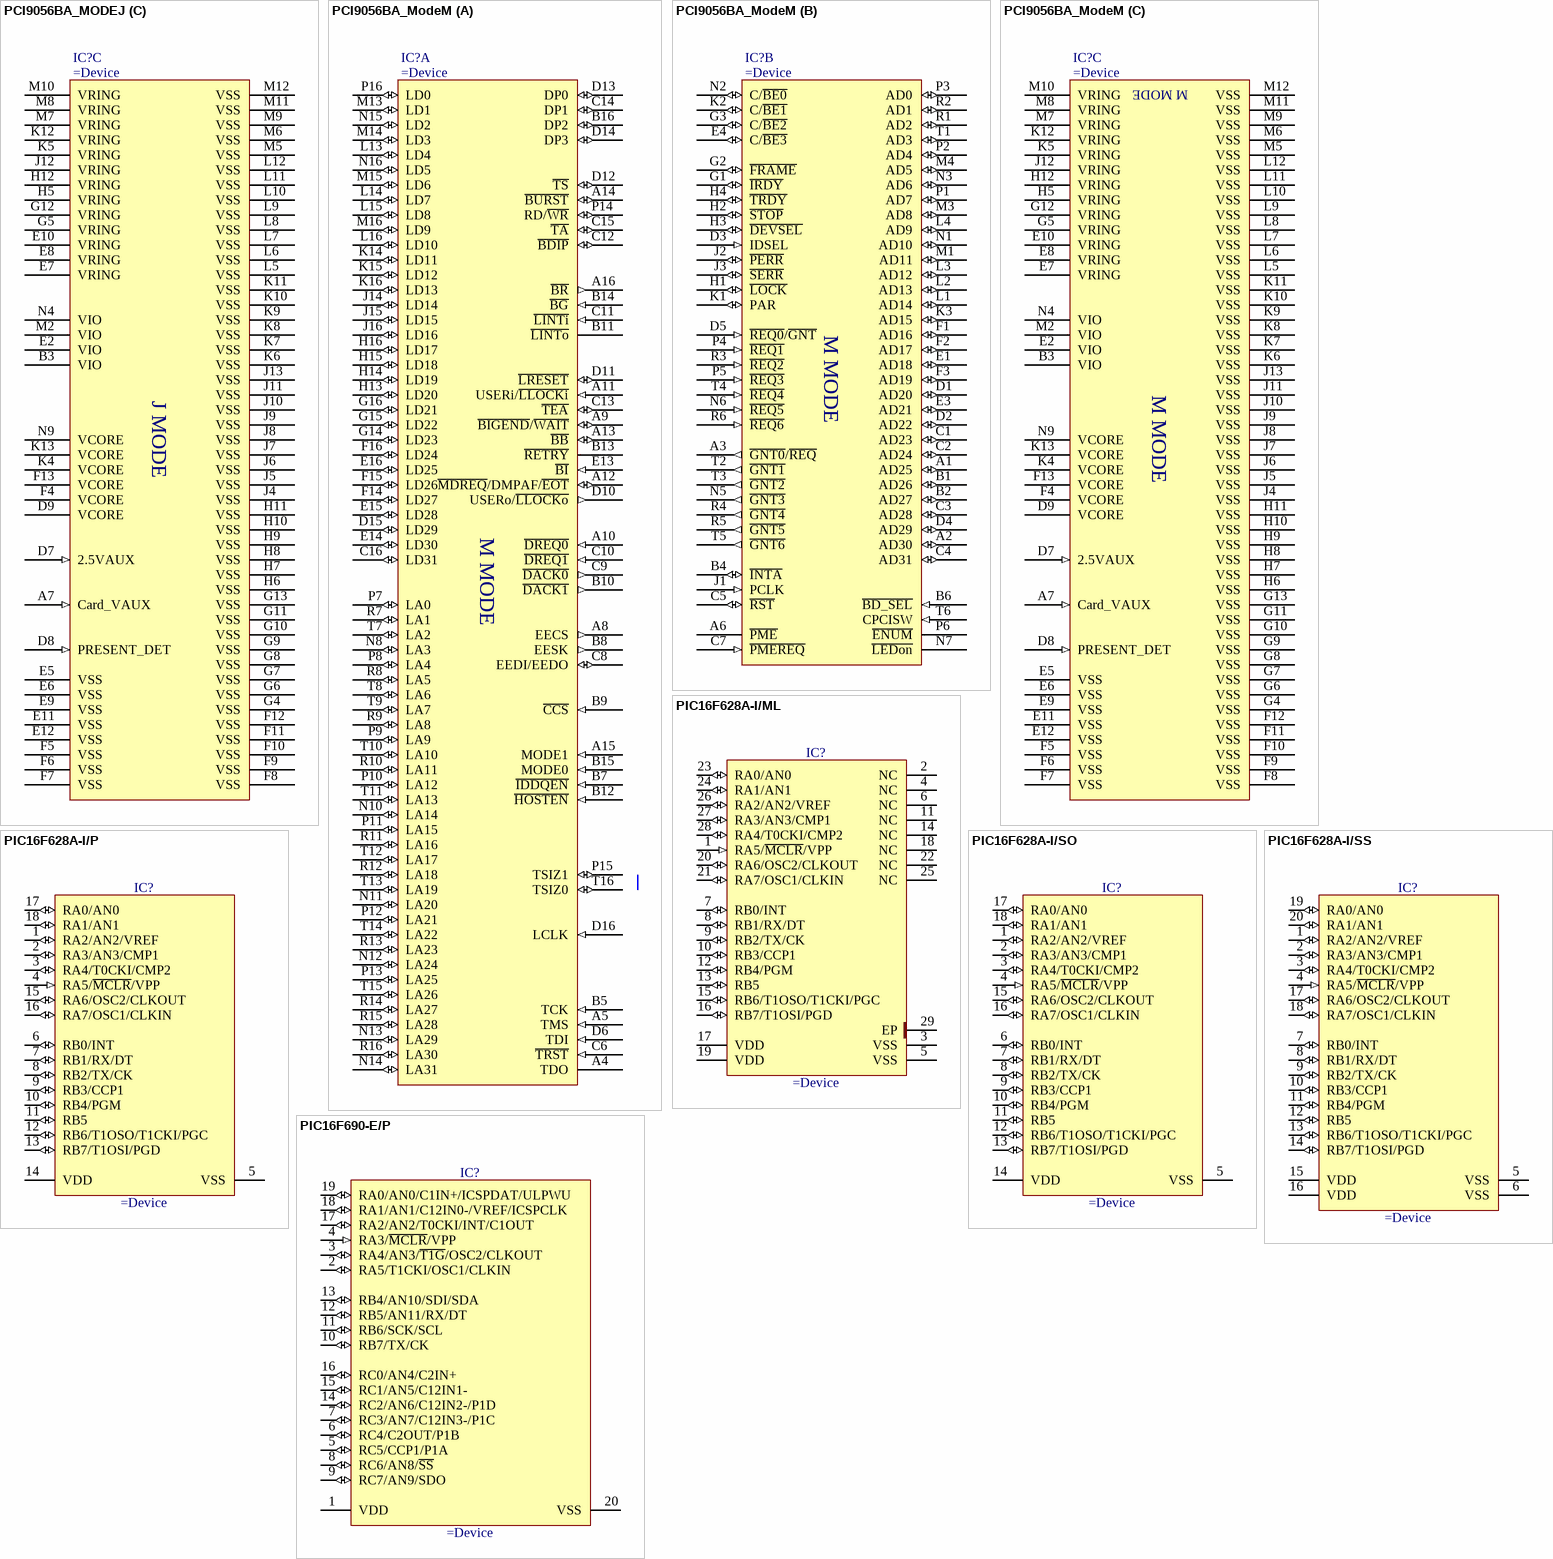
[diagram p68: symbols PCI9056BA_MODEJ to PIC16F690-E/P]

## PCI9056BA_MODEJ
designator IC?
32-Bit 66MHz PCI Bus Mastering I/O Accelerator For PowerQUICC And Generic 32-Bit, 66MHz Local Bus Design
part A pins: A4 TDO (hiz), A5 TMS (in), A8 EECS (out), A9 ~{BIGEND} (in), A10 ~{DREQ0} (in), A11 USERi/~{LLOCKi} (in), A12 DMPAF/~{EOT} (io), A13 BREQi (in), A14 ~{BLAST} (io), A15 MODE1 (in), A16 LHOLD (out), B5 TCK (in), B7 ~{IDDQEN} (in), B8 EESK (out), B9 ~{CCS} (in), B10 ~{DACK1} (out), B11 ~{LINTo} (oc), B12 ~{HOSTEN} (in), B13 BREQo (hiz), B14 LHOLDA (in), B15 MODE0 (in), B16 DP1 (io), C6 ~{TRST} (in), C8 EEDI/EEDO (io), C9 ~{DACK0} (out), C10 ~{DREQ1} (in), C11 ~{LINTi} (in), C12 ~{WAIT} (io), C13 ~{LSERR} (oc), C14 DP2 (io), C15 ~{READY} (io), C16 LAD0 (io), D6 TDI (in), D10 USERo/~{LLOCKo} (out), D11 ~{LRESET} (io), D12 ~{ADS} (io), D13 DP3 (io), D14 DP0 (io), D15 LAD2 (io), D16 LCLK (in), E13 ~{BTERM} (io), E14 LAD1 (io), E15 LAD3 (io), E16 LAD6 (io), F14 LAD4 (io), F15 LAD5 (io), F16 LAD7 (io), G14 LAD8 (io), G15 LAD9 (io), G16 LAD10 (io), H13 LAD11 (io), H14 LAD12 (io), H15 LAD13 (io), H16 LAD14 (io), J14 LAD17 (io), J15 LAD16 (io), J16 LAD15 (io), K14 LAD20 (io), K15 LAD19 (io), K16 LAD18 (io), L13 LAD27 (io), L14 LAD24 (io), L15 LAD23 (io), L16 LAD21 (io), M13 LAD30 (io), M14 LAD28 (io), M15 LAD25 (io), M16 LAD22 (io), N8 LA28 (io), N10 LA17 (io), N11 LA11 (io), N12 LA7 (io), N13 LA2 (io), N14 ~{LBE0} (io), N15 LAD29 (io), N16 LAD26 (io), P7 DT/~{R} (hiz), P8 LA27 (io), P9 LA22 (io), P10 LA19 (io), P11 LA16 (io), P12 LA10 (io), P13 LA6 (io), P14 LW/~{R} (io), P15 ~{LBE2} (io), P16 LAD31 (io), R7 ~{DEN} (hiz), R8 LA26 (io), R9 LA23 (io), R10 LA20 (io), R11 LA15 (io), R12 LA13 (io), R13 LA8 (io), R14 LA4 (io), R15 LA3 (io), R16 ~{LBE1} (io), T7 ALE (io), T8 LA25 (io), T9 LA24 (io), T10 LA21 (io), T11 LA18 (io), T12 LA14 (io), T13 LA12 (io), T14 LA9 (io), T15 LA5 (io), T16 ~{LBE3} (io)
part B pins: A1 AD25 (io), A2 AD30 (io), A3 ~{GNT0}/~{REQ} (hiz), A6 ~{PME} (oc), B1 AD26 (io), B2 AD27 (io), B4 ~{INTA} (io), B6 ~{BD_SEL} (in), C1 AD23 (io), C2 AD24 (io), C3 AD28 (io), C4 AD31 (io), C5 ~{RST} (io), C7 ~{PMEREQ} (in), D1 AD20 (io), D2 AD22 (io), D3 IDSEL (in), D4 AD29 (io), D5 ~{REQ0}/~{GNT} (in), E1 AD18 (io), E3 AD21 (io), E4 C/~{BE3} (io), F1 AD16 (io), F2 AD17 (io), F3 AD19 (io), G1 ~{IRDY} (io), G2 ~{FRAME} (io), G3 C/~{BE2} (io), H1 ~{LOCK} (io), H2 ~{STOP} (io), H3 ~{DEVSEL} (io), H4 ~{TRDY} (io), J1 PCLK (in), J2 ~{PERR} (io), J3 ~{SERR} (io), K1 PAR (io), K2 C/~{BE1} (io), K3 AD15 (io), L1 AD14 (io), L2 AD13 (io), L3 AD12 (io), L4 AD9 (io), M1 AD11 (io), M3 AD8 (io), M4 AD5 (io), N1 AD10 (io), N2 C/~{BE0} (io), N3 AD6 (io), N5 ~{GNT3} (out), N6 ~{REQ5} (in), N7 ~{LEDon} (out), P1 AD7 (io), P2 AD4 (io), P3 AD0 (io), P4 ~{REQ1} (in), P5 ~{REQ3} (in), P6 ~{ENUM} (oc), R1 AD2 (io), R2 AD1 (io), R3 ~{REQ2} (in), R4 ~{GNT4} (out), R5 ~{GNT5} (out), R6 ~{REQ6} (in), T1 AD3 (io), T2 ~{GNT1} (out), T3 ~{GNT2} (out), T4 ~{REQ4} (in), T5 ~{GNT6} (out), T6 CPCISW (in)
part C pins: A7 Card_VAUX (in), B3 VIO (power), D7 2.5VAUX (in), D8 PRESENT_DET (in), D9 VCORE (power), E2 VIO (power), E5 VSS (power), E6 VSS (power), E7 VRING (power), E8 VRING (power), E9 VSS (power), E10 VRING (power), E11 VSS (power), E12 VSS (power), F4 VCORE (power), F5 VSS (power), F6 VSS (power), F7 VSS (power), F8 VSS (power), F9 VSS (power), F10 VSS (power), F11 VSS (power), F12 VSS (power), F13 VCORE (power), G4 VSS (power), G5 VRING (power), G6 VSS (power), G7 VSS (power), G8 VSS (power), G9 VSS (power), G10 VSS (power), G11 VSS (power), G12 VRING (power), G13 VSS (power), H5 VRING (power), H6 VSS (power), H7 VSS (power), H8 VSS (power), H9 VSS (power), H10 VSS (power), H11 VSS (power), H12 VRING (power), J4 VSS (power), J5 VSS (power), J6 VSS (power), J7 VSS (power), J8 VSS (power), J9 VSS (power), J10 VSS (power), J11 VSS (power), J12 VRING (power), J13 VSS (power), K4 VCORE (power), K5 VRING (power), K6 VSS (power), K7 VSS (power), K8 VSS (power), K9 VSS (power), K10 VSS (power), K11 VSS (power), K12 VRING (power), K13 VCORE (power), L5 VSS (power), L6 VSS (power), L7 VSS (power), L8 VSS (power), L9 VSS (power), L10 VSS (power), L11 VSS (power), L12 VSS (power), M2 VIO (power), M5 VSS (power), M6 VSS (power), M7 VRING (power), M8 VRING (power), M9 VSS (power), M10 VRING (power), M11 VSS (power), M12 VSS (power), N4 VIO (power), N9 VCORE (power)
part A text: J MODE
part B text: J MODE
part C text: J MODE
